# Altium schematic symbol library Minh_Lib.SchLib: 619 symbols (part 4 of 4) (continued)
## TAJC106K025RNJ
designator C?  Supplier Part Number 1: 1360264
钽电容 10uF ±10% 25V 1.8Ω C型6032; Manufacturer: Kyocera AVX; Manufacturer Part Number: TAJC106K025RNJ; Dielectric Material: Tantalum; ESR (Equivalent Series Resistance): 1.8R; Leakage Current: 2.5uA; Dissipation Factor: 6%; Polarity: Polar; Supplier 1: RSComponents; RoHS: Yes; Category: Tantalum Capacitors; Stock 1: 520; Pricing 1: 500=0.40900, 1000=0.39300, 2500=0.37300 (USD); Mount: Surface Mount,PCB; Case/Package: Molded; Number of Pins: 2; Case Code (Metric): 6032; Case Code (Imperial): 2312; Min Operating Temperature: -55°C; Max Operating Temperature: 125°C; Capacitance: 10uF; Tolerance: 10%; Package Quantity: 1; Voltage Rating: 25V; Packaging: Tape and Reel; Voltage Rating (DC): 25V; Termination: SMD/SMT; Voltage: 25V; Features: General Purpose; Series: TAJ; Construction: Flat; Length: 6mm; Width: 3.2mm; Height: 2.6mm; Depth: 3.2mm; Height - Seated (Max): 0.11inch; Radiation Hardening: No; REACH SVHC: No SVHC; Lead Free: Lead Free; RoHS Compliant: Yes; ComponentLink1URL: https://datasheet.ciiva.com/11793/0900766b80ccdc61-11793443.pdf?src-supplier=RSComponents; ComponentLink1Description: https://datasheet.ciiva.com/11793/0900766b80ccdc61-11793443.pdf?src-supplier=RSComponents; ComponentLink2URL: https://datasheet.ciiva.com/26341/559475-da-01-en-tacc-c-6-0-mm-x-3-2-mm-x-2-6-mm-10-uf-26341814.pdf?src-supplier=Conrad; ComponentLink2Description: https://datasheet.ciiva.com/26341/559475-da-01-en-tacc-c-6-0-mm-x-3-2-mm-x-2-6-mm-10-uf-26341814.pdf?src-supplier=Conrad; ComponentLink3URL: https://datasheet.ciiva.com/26787/tajc106k025rnj-26787060.pdf?src-supplier=IIIC; ComponentLink3Description: https://datasheet.ciiva.com/26787/tajc106k025rnj-26787060.pdf?src-supplier=IIIC; ComponentLink4URL: https://datasheet.ciiva.com/5937/taj-5937098.pdf?src-supplier=Farnell; ComponentLink4Description: https://datasheet.ciiva.com/5937/taj-5937098.pdf?src-supplier=Farnell; ComponentLink5URL: https://datasheet.ciiva.com/16486/taj-16486005.pdf?src-supplier=Avnet+Asia; ComponentLink5Description: https://datasheet.ciiva.com/16486/taj-16486005.pdf?src-supplier=Avnet+Asia; ComponentLink6URL: https://datasheet.ciiva.com/16492/taj-16492831.pdf?src-supplier=Future+Electronics; ComponentLink6Description: https://datasheet.ciiva.com/16492/taj-16492831.pdf?src-supplier=Future+Electronics; ComponentLink7URL: https://datasheet.ciiva.com/3004/taj-3004473.pdf?src-supplier=Avnet; ComponentLink7Description: https://datasheet.ciiva.com/3004/taj-3004473.pdf?src-supplier=Avnet; ComponentLink8URL: https://datasheet.ciiva.com/14590/70001050-14590630.pdf?src-supplier=Allied+Electronics; ComponentLink8Description: https://datasheet.ciiva.com/14590/70001050-14590630.pdf?src-supplier=Allied+Electronics; ComponentLink9URL: https://datasheet.ciiva.com/263/taj-263970.pdf?src-supplier=Digi-Key; ComponentLink9Description: https://datasheet.ciiva.com/263/taj-263970.pdf?src-supplier=Digi-Key; ComponentLink10URL: https://datasheet.ciiva.com/263/taj-263968.pdf?src-supplier=Digi-Key; ComponentLink10Description: https://datasheet.ciiva.com/263/taj-263968.pdf?src-supplier=Digi-Key; ComponentLink11URL: https://datasheet.ciiva.com/7730/1826076-7730747.pdf?src-supplier=Element14; ComponentLink11Description: https://datasheet.ciiva.com/7730/1826076-7730747.pdf?src-supplier=Element14; ComponentLink12URL: https://datasheet.ciiva.com/7730/1680476-7730744.pdf?src-supplier=Element14; ComponentLink12Description: https://datasheet.ciiva.com/7730/1680476-7730744.pdf?src-supplier=Element14; ComponentLink13URL: https://datasheet.ciiva.com/7730/1826076-7730746.pdf?src-supplier=Element14; ComponentLink13Description: https://datasheet.ciiva.com/7730/1826076-7730746.pdf?src-supplier=Element14; ComponentLink14URL: https://datasheet.ciiva.com/7730/1826076-7730745.pdf?src-supplier=Element14; ComponentLink14Description: https://datasheet.ciiva.com/7730/1826076-7730745.pdf?src-supplier=Element14; ComponentLink15URL: https://datasheet.ciiva.com/7730/taj-7730982.pdf?src-supplier=Element14; ComponentLink15Description: https://datasheet.ciiva.com/7730/taj-7730982.pdf?src-supplier=Element14; ComponentLink16URL: https://datasheet.ciiva.com/263/taj-263969.pdf?src-supplier=Digi-Key; ComponentLink16Description: https://datasheet.ciiva.com/263/taj-263969.pdf?src-supplier=Digi-Key; ComponentLink17URL: https://datasheet.ciiva.com/3004/taj-3004474.pdf?src-supplier=Avnet; ComponentLink17Description: https://datasheet.ciiva.com/3004/taj-3004474.pdf?src-supplier=Avnet
footprint Capacitor/Tantalum  - SMD6032/C - AVX (C-6032 / AVX)
pins: 1, 2
text: +

## TAJC106K035RNJ
designator C?  Supplier Part Number 1: 23H0347
钽电容 10uF ±10% 35V 1.6Ω C型6032; Manufacturer: Kyocera AVX; Manufacturer Part Number: TAJC106K035RNJ; Dielectric Material: Tantalum; Tolerance: 20%; ESR (Equivalent Series Resistance): 1.6R; Leakage Current: 3.5uA; Polarity: Polar; Voltage: 25V; Dissipation Factor: 6%; Supplier 1: Newark; RoHS: Yes; Category: Tantalum Capacitors; Mount: Surface Mount,PCB; Case/Package: Molded; Number of Pins: 2; Case Code (Imperial): 2412; Case Code (Metric): 6032; Min Operating Temperature: -55°C; Max Operating Temperature: 125°C; Capacitance: 10uF; Voltage Rating (DC): 35V; Voltage Rating: 35V; Packaging: Tape and Reel; Package Quantity: 1; Termination: SMD/SMT; Features: General Purpose; Series: TAJ; Construction: Flat; Length: 6mm; Width: 3.2mm; Height: 2.6mm; Depth: 3.2mm; Height - Seated (Max): 0.11inch; Radiation Hardening: No; Lead Free: Lead Free; RoHS Compliant: Yes; REACH SVHC: No SVHC; ComponentLink1URL: https://datasheet.ciiva.com/11793/0900766b80ccdc61-11793205.pdf?src-supplier=RSComponents; ComponentLink1Description: https://datasheet.ciiva.com/11793/0900766b80ccdc61-11793205.pdf?src-supplier=RSComponents; ComponentLink2URL: https://datasheet.ciiva.com/26341/559442-da-01-en-tacc-c-6-0-mm-x-3-2-mm-x-2-6-mm-10-uf-26341782.pdf?src-supplier=Conrad; ComponentLink2Description: https://datasheet.ciiva.com/26341/559442-da-01-en-tacc-c-6-0-mm-x-3-2-mm-x-2-6-mm-10-uf-26341782.pdf?src-supplier=Conrad; ComponentLink3URL: https://datasheet.ciiva.com/5937/taj-5937099.pdf?src-supplier=Farnell; ComponentLink3Description: https://datasheet.ciiva.com/5937/taj-5937099.pdf?src-supplier=Farnell; ComponentLink4URL: https://datasheet.ciiva.com/15163/getdatasheetpartid-110753-15163367.pdf?src-supplier=Verical; ComponentLink4Description: https://datasheet.ciiva.com/15163/getdatasheetpartid-110753-15163367.pdf?src-supplier=Verical; ComponentLink5URL: https://datasheet.ciiva.com/3004/taj-3004476.pdf?src-supplier=Avnet; ComponentLink5Description: https://datasheet.ciiva.com/3004/taj-3004476.pdf?src-supplier=Avnet; ComponentLink6URL: https://datasheet.ciiva.com/14590/70001050-14590313.pdf?src-supplier=Allied+Electronics; ComponentLink6Description: https://datasheet.ciiva.com/14590/70001050-14590313.pdf?src-supplier=Allied+Electronics; ComponentLink7URL: https://datasheet.ciiva.com/12911/taj-27497-12911561.pdf?src-supplier=Mouser; ComponentLink7Description: https://datasheet.ciiva.com/12911/taj-27497-12911561.pdf?src-supplier=Mouser; ComponentLink8URL: https://datasheet.ciiva.com/264/taj-264351.pdf?src-supplier=Digi-Key; ComponentLink8Description: https://datasheet.ciiva.com/264/taj-264351.pdf?src-supplier=Digi-Key; ComponentLink9URL: https://datasheet.ciiva.com/264/taj-264349.pdf?src-supplier=Digi-Key; ComponentLink9Description: https://datasheet.ciiva.com/264/taj-264349.pdf?src-supplier=Digi-Key; ComponentLink10URL: https://datasheet.ciiva.com/264/taj-264350.pdf?src-supplier=Digi-Key; ComponentLink10Description: https://datasheet.ciiva.com/264/taj-264350.pdf?src-supplier=Digi-Key; ComponentLink11URL: https://datasheet.ciiva.com/7730/13070-7730749.pdf?src-supplier=Element14; ComponentLink11Description: https://datasheet.ciiva.com/7730/13070-7730749.pdf?src-supplier=Element14; ComponentLink12URL: https://datasheet.ciiva.com/7730/1680476-7730748.pdf?src-supplier=Element14; ComponentLink12Description: https://datasheet.ciiva.com/7730/1680476-7730748.pdf?src-supplier=Element14; ComponentLink13URL: https://datasheet.ciiva.com/7730/1703059-7730750.pdf?src-supplier=Element14; ComponentLink13Description: https://datasheet.ciiva.com/7730/1703059-7730750.pdf?src-supplier=Element14; ComponentLink14URL: https://datasheet.ciiva.com/7730/1703059-7730751.pdf?src-supplier=Element14; ComponentLink14Description: https://datasheet.ciiva.com/7730/1703059-7730751.pdf?src-supplier=Element14; ComponentLink15URL: https://datasheet.ciiva.com/7730/taj-7730983.pdf?src-supplier=Element14; ComponentLink15Description: https://datasheet.ciiva.com/7730/taj-7730983.pdf?src-supplier=Element14; ComponentLink16URL: https://datasheet.ciiva.com/16486/taj-16486007.pdf?src-supplier=Avnet+Asia; ComponentLink16Description: https://datasheet.ciiva.com/16486/taj-16486007.pdf?src-supplier=Avnet+Asia; ComponentLink17URL: https://datasheet.ciiva.com/3004/taj-3004475.pdf?src-supplier=Avnet; ComponentLink17Description: https://datasheet.ciiva.com/3004/taj-3004475.pdf?src-supplier=Avnet
footprint Capacitor/Tantalum  - SMD6032/C - AVX (C-6032 / AVX)
pins: 1, 2
text: +

## TAJC107K006RNJ
designator C?  Supplier Part Number 1: 1364517
钽电容 100uF ±10% 6.3V 0.9Ω C型6032; Manufacturer: Kyocera AVX; Manufacturer Part Number: TAJC107K006RNJ; Dielectric Material: Tantalum; ESR (Equivalent Series Resistance): 900mR; Leakage Current: 6.3uA; Polarity: Polar; Dissipation Factor: 6%; Supplier 1: RSComponents; RoHS: Yes; Category: Tantalum Capacitors; Stock 1: 1; Pricing 1: 20=0.52900, 100=0.36400, 400=0.34700, 1000=0.21400 (USD); Mount: Surface Mount; Case/Package: Molded; Case Code (Metric): 6032; Case Code (Imperial): 2312; Min Operating Temperature: -55°C; Max Operating Temperature: 125°C; Capacitance: 100uF; Tolerance: 10%; Packaging: Tape and Reel; Voltage Rating: 6.3V; Package Quantity: 1; Termination: SMD/SMT; Features: General Purpose; Series: TAJ; Construction: Flat; Length: 6mm; Width: 3.2mm; Height: 2.6mm; Depth: 3.2mm; Height - Seated (Max): 0.11inch; Radiation Hardening: No; REACH SVHC: No SVHC; Lead Free: Lead Free; RoHS Compliant: Yes; ComponentLink1URL: https://datasheet.ciiva.com/26341/559444-da-01-en-tacc-c-6-0-mm-x-3-2-mm-x-2-6-mm-100-uf-26341781.pdf?src-supplier=Conrad; ComponentLink1Description: https://datasheet.ciiva.com/26341/559444-da-01-en-tacc-c-6-0-mm-x-3-2-mm-x-2-6-mm-100-uf-26341781.pdf?src-supplier=Conrad; ComponentLink2URL: https://datasheet.ciiva.com/18710/taj-eng-18710877.pdf?src-supplier=Distrelec; ComponentLink2Description: https://datasheet.ciiva.com/18710/taj-eng-18710877.pdf?src-supplier=Distrelec; ComponentLink3URL: https://datasheet.ciiva.com/7720/1680476-7720614.pdf?src-supplier=Element14; ComponentLink3Description: https://datasheet.ciiva.com/7720/1680476-7720614.pdf?src-supplier=Element14; ComponentLink4URL: https://datasheet.ciiva.com/7720/1680476-7720613.pdf?src-supplier=Element14; ComponentLink4Description: https://datasheet.ciiva.com/7720/1680476-7720613.pdf?src-supplier=Element14; ComponentLink5URL: https://datasheet.ciiva.com/264/taj-264329.pdf?src-supplier=Digi-Key; ComponentLink5Description: https://datasheet.ciiva.com/264/taj-264329.pdf?src-supplier=Digi-Key; ComponentLink6URL: https://datasheet.ciiva.com/264/taj-264328.pdf?src-supplier=Digi-Key; ComponentLink6Description: https://datasheet.ciiva.com/264/taj-264328.pdf?src-supplier=Digi-Key; ComponentLink7URL: https://datasheet.ciiva.com/264/taj-264330.pdf?src-supplier=Digi-Key; ComponentLink7Description: https://datasheet.ciiva.com/264/taj-264330.pdf?src-supplier=Digi-Key; ComponentLink8URL: https://datasheet.ciiva.com/12910/taj-27497-12910474.pdf?src-supplier=Mouser; ComponentLink8Description: https://datasheet.ciiva.com/12910/taj-27497-12910474.pdf?src-supplier=Mouser; ComponentLink9URL: https://datasheet.ciiva.com/3004/taj-3004480.pdf?src-supplier=Avnet; ComponentLink9Description: https://datasheet.ciiva.com/3004/taj-3004480.pdf?src-supplier=Avnet; ComponentLink10URL: https://datasheet.ciiva.com/3004/taj-3004481.pdf?src-supplier=Avnet; ComponentLink10Description: https://datasheet.ciiva.com/3004/taj-3004481.pdf?src-supplier=Avnet
footprint Capacitor/Tantalum  - SMD6032/C - AVX (C-6032 / AVX)
pins: 1, 2
text: +

## TAJC107K010RNJ
designator C?  Supplier Part Number 1: 1360270
钽电容 100uF ±10% 10V 1.2Ω C型6032; Manufacturer: Kyocera AVX; Manufacturer Part Number: TAJC107K010RNJ; Dielectric Material: Tantalum; ESR (Equivalent Series Resistance): 1.2R; Leakage Current: 10uA; Polarity: Polar; Dissipation Factor: 8%; Supplier 1: RSComponents; RoHS: Yes; Category: Tantalum Capacitors; Stock 1: 300; Pricing 1: 500=0.21900, 2500=0.19900, 5000=0.19400 (USD); Mount: Surface Mount,PCB; Case/Package: Molded; Number of Pins: 2; Case Code (Imperial): 2412; Case Code (Metric): 6032; Min Operating Temperature: -55°C; Max Operating Temperature: 125°C; Capacitance: 100uF; Tolerance: 10%; Voltage Rating (DC): 10V; Packaging: Tape and Reel; Package Quantity: 1; Voltage Rating: 10V; Termination: SMD/SMT; Voltage: 10V; Features: General Purpose; Series: TAJ; Construction: Flat; Length: 6mm; Width: 3.2mm; Height: 2.6mm; Depth: 3.2mm; Height - Seated (Max): 0.11inch; Radiation Hardening: No; REACH SVHC: No SVHC; Lead Free: Lead Free; RoHS Compliant: Yes; ComponentLink1URL: https://datasheet.ciiva.com/11793/0900766b80ccdc61-11793710.pdf?src-supplier=RSComponents; ComponentLink1Description: https://datasheet.ciiva.com/11793/0900766b80ccdc61-11793710.pdf?src-supplier=RSComponents; ComponentLink2URL: https://datasheet.ciiva.com/6186/13070-6186737.pdf?src-supplier=Farnell; ComponentLink2Description: https://datasheet.ciiva.com/6186/13070-6186737.pdf?src-supplier=Farnell; ComponentLink3URL: https://datasheet.ciiva.com/26341/559445-da-01-en-tacc-c-6-0-mm-x-3-2-mm-x-2-6-mm-100-uf-26341786.pdf?src-supplier=Conrad; ComponentLink3Description: https://datasheet.ciiva.com/26341/559445-da-01-en-tacc-c-6-0-mm-x-3-2-mm-x-2-6-mm-100-uf-26341786.pdf?src-supplier=Conrad; ComponentLink4URL: https://datasheet.ciiva.com/18710/taj-eng-18710871.pdf?src-supplier=Distrelec; ComponentLink4Description: https://datasheet.ciiva.com/18710/taj-eng-18710871.pdf?src-supplier=Distrelec; ComponentLink5URL: https://datasheet.ciiva.com/15163/getdatasheetpartid-87208-15163226.pdf?src-supplier=Verical; ComponentLink5Description: https://datasheet.ciiva.com/15163/getdatasheetpartid-87208-15163226.pdf?src-supplier=Verical; ComponentLink6URL: https://datasheet.ciiva.com/16350/taj-16350362.pdf?src-supplier=Future+Electronics; ComponentLink6Description: https://datasheet.ciiva.com/16350/taj-16350362.pdf?src-supplier=Future+Electronics; ComponentLink7URL: https://datasheet.ciiva.com/11226/taj-11226030.pdf?src-supplier=Avnet; ComponentLink7Description: https://datasheet.ciiva.com/11226/taj-11226030.pdf?src-supplier=Avnet; ComponentLink8URL: https://datasheet.ciiva.com/14608/70001050-14608635.pdf?src-supplier=Allied+Electronics; ComponentLink8Description: https://datasheet.ciiva.com/14608/70001050-14608635.pdf?src-supplier=Allied+Electronics; ComponentLink9URL: https://datasheet.ciiva.com/14590/70001050-14590206.pdf?src-supplier=Allied+Electronics; ComponentLink9Description: https://datasheet.ciiva.com/14590/70001050-14590206.pdf?src-supplier=Allied+Electronics; ComponentLink10URL: https://datasheet.ciiva.com/264/taj-264318.pdf?src-supplier=Digi-Key; ComponentLink10Description: https://datasheet.ciiva.com/264/taj-264318.pdf?src-supplier=Digi-Key; ComponentLink11URL: https://datasheet.ciiva.com/264/taj-264316.pdf?src-supplier=Digi-Key; ComponentLink11Description: https://datasheet.ciiva.com/264/taj-264316.pdf?src-supplier=Digi-Key; ComponentLink12URL: https://datasheet.ciiva.com/264/taj-264317.pdf?src-supplier=Digi-Key; ComponentLink12Description: https://datasheet.ciiva.com/264/taj-264317.pdf?src-supplier=Digi-Key; ComponentLink13URL: https://datasheet.ciiva.com/7720/13070-7720615.pdf?src-supplier=Element14; ComponentLink13Description: https://datasheet.ciiva.com/7720/13070-7720615.pdf?src-supplier=Element14; ComponentLink14URL: https://datasheet.ciiva.com/7720/1680476-7720617.pdf?src-supplier=Element14; ComponentLink14Description: https://datasheet.ciiva.com/7720/1680476-7720617.pdf?src-supplier=Element14; ComponentLink15URL: https://datasheet.ciiva.com/7720/taj-7720618.pdf?src-supplier=Element14; ComponentLink15Description: https://datasheet.ciiva.com/7720/taj-7720618.pdf?src-supplier=Element14; ComponentLink16URL: https://datasheet.ciiva.com/7720/taj-7720616.pdf?src-supplier=Element14; ComponentLink16Description: https://datasheet.ciiva.com/7720/taj-7720616.pdf?src-supplier=Element14; ComponentLink17URL: https://datasheet.ciiva.com/7720/taj-7720830.pdf?src-supplier=Element14; ComponentLink17Description: https://datasheet.ciiva.com/7720/taj-7720830.pdf?src-supplier=Element14; ComponentLink18URL: https://datasheet.ciiva.com/16486/taj-16486014.pdf?src-supplier=Avnet+Asia; ComponentLink18Description: https://datasheet.ciiva.com/16486/taj-16486014.pdf?src-supplier=Avnet+Asia; ComponentLink19URL: https://datasheet.ciiva.com/3004/taj-3004482.pdf?src-supplier=Avnet; ComponentLink19Description: https://datasheet.ciiva.com/3004/taj-3004482.pdf?src-supplier=Avnet
footprint Capacitor/Tantalum  - SMD6032/C - AVX (C-6032 / AVX)
pins: 1, 2
text: +

## TAJC107K016RNJ
designator C?  Supplier Part Number 1: 478-5258-1-ND
钽电容 100uF ±10% 16V 1Ω C型6032; Manufacturer: Kyocera AVX; Manufacturer Part Number: TAJC107K016RNJ; ESR (Equivalent Series Resistance): 1R; Leakage Current: 16uA; Polarity: Polar; Dissipation Factor: 8%; Supplier 1: Digi-Key; RoHS: Yes; Category: Tantalum Capacitors; Stock 1: 1470; Pricing 1: 1=1.31000, 10=1.03600, 50=0.89800, 100=0.77720 (USD); Mount: Surface Mount; Case/Package: Molded; Number of Pins: 2; Case Code (Imperial): 2412; Case Code (Metric): 6032; Min Operating Temperature: -55°C; Max Operating Temperature: 125°C; Capacitance: 100uF; Tolerance: 10%; Voltage Rating: 16V; Package Quantity: 1; Packaging: Tape and Reel; Termination: SMD/SMT; Voltage Rating (DC): 16V; Features: General Purpose; Series: TAJ; Construction: Flat; Length: 6mm; Width: 3.2mm; Height: 2.8mm; Depth: 3.2mm; Height - Seated (Max): 0.11inch; Radiation Hardening: No; REACH SVHC: No SVHC; Lead Free: Lead Free; RoHS Compliant: Yes; ComponentLink1URL: https://datasheet.ciiva.com/22667/1719052-22667577.pdf?src-supplier=Element14; ComponentLink1Description: https://datasheet.ciiva.com/22667/1719052-22667577.pdf?src-supplier=Element14; ComponentLink2URL: https://datasheet.ciiva.com/28609/1719052-28609194.pdf?src-supplier=Element14; ComponentLink2Description: https://datasheet.ciiva.com/28609/1719052-28609194.pdf?src-supplier=Element14; ComponentLink3URL: https://datasheet.ciiva.com/264/taj-264646.pdf?src-supplier=Digi-Key; ComponentLink3Description: https://datasheet.ciiva.com/264/taj-264646.pdf?src-supplier=Digi-Key; ComponentLink4URL: https://datasheet.ciiva.com/264/taj-264645.pdf?src-supplier=Digi-Key; ComponentLink4Description: https://datasheet.ciiva.com/264/taj-264645.pdf?src-supplier=Digi-Key; ComponentLink5URL: https://datasheet.ciiva.com/264/taj-264647.pdf?src-supplier=Digi-Key; ComponentLink5Description: https://datasheet.ciiva.com/264/taj-264647.pdf?src-supplier=Digi-Key; ComponentLink6URL: https://datasheet.ciiva.com/11216/taj-11216685.pdf?src-supplier=Avnet; ComponentLink6Description: https://datasheet.ciiva.com/11216/taj-11216685.pdf?src-supplier=Avnet
footprint Capacitor/Tantalum  - SMD6032/C - AVX (C-6032 / AVX)
pins: 1, 2
text: +

## TAJC474K050RNJ
designator C?  Supplier Part Number 1: TAJC474K050RNJ
钽电容 470nF ±10% 50V 8Ω C型6032; Manufacturer: Kyocera AVX; Dielectric Material: Tantalum; ESR (Equivalent Series Resistance): 8R; Leakage Current: 500nA; Polarity: Polar; Dissipation Factor: 4%; Q Factor: 4; Supplier 1: Arrow Electronics; Manufacturer Part Number: TAJC474K050RNJ; RoHS: Yes; Category: Tantalum Capacitors; Stock 1: 280; Pricing 1: 1=1.01870, 10=0.78040, 25=0.77240, 50=0.76420, 100=0.54780, 500=0.33230 (USD); Mount: Surface Mount; Case/Package: Molded; Number of Pins: 2; Case Code (Metric): 6032; Case Code (Imperial): 2412; Min Operating Temperature: -55°C; Max Operating Temperature: 125°C; Capacitance: 470nF; Tolerance: 10%; Package Quantity: 500; Voltage Rating: 50V; Packaging: Tape and Reel; Termination: SMD/SMT; Voltage Rating (DC): 50V; Features: General Purpose; Series: TAJ; Construction: Flat; Length: 6mm; Width: 0.126inch; Height: 2.8mm; Depth: 3.2mm; Height - Seated (Max): 0.11inch; Radiation Hardening: No; Lead Free: Lead Free; RoHS Compliant: Yes; ComponentLink1URL: https://datasheet.ciiva.com/12883/taj-27497-12883740.pdf?src-supplier=Mouser; ComponentLink1Description: https://datasheet.ciiva.com/12883/taj-27497-12883740.pdf?src-supplier=Mouser; ComponentLink2URL: https://datasheet.ciiva.com/11219/taj-11219271.pdf?src-supplier=Avnet; ComponentLink2Description: https://datasheet.ciiva.com/11219/taj-11219271.pdf?src-supplier=Avnet; ComponentLink3URL: https://datasheet.ciiva.com/17337/taj-17337293.pdf?src-supplier=Avnet+Europe; ComponentLink3Description: https://datasheet.ciiva.com/17337/taj-17337293.pdf?src-supplier=Avnet+Europe; ComponentLink4URL: https://datasheet.ciiva.com/284/taj-284115.pdf?src-supplier=Digi-Key; ComponentLink4Description: https://datasheet.ciiva.com/284/taj-284115.pdf?src-supplier=Digi-Key
footprint Capacitor/Tantalum  - SMD6032/C - AVX (C-6032 / AVX)
pins: 1, 2
text: +

## TAJC684K050RNJ
designator C?  Supplier Part Number 1: 581-TAJC684K050RNJ
钽电容 680nF ±10% 50V 7Ω C型6032; Manufacturer: Kyocera AVX; Manufacturer Part Number: TAJC684K050RNJ; Dielectric Material: Tantalum; ESR (Equivalent Series Resistance): 7R; Leakage Current: 500nA; Polarity: Polar; Dissipation Factor: 4%; Q Factor: 4; Supplier 1: Mouser; RoHS: Yes; Category: Tantalum Capacitors; Stock 1: 252; Pricing 1: 1=1.88000, 10=1.49000, 50=1.49000, 100=1.12000, 1000=0.84200, 10000=0.84200 (USD); Mount: Surface Mount; Case/Package: Molded; Number of Pins: 2; Case Code (Imperial): 2412; Case Code (Metric): 6032; Weight: 0.005291oz; Min Operating Temperature: -55°C; Max Operating Temperature: 125°C; Capacitance: 680nF; Voltage Rating: 50V; Tolerance: 10%; Packaging: Tape and Reel; Package Quantity: 500; Resistance: 7R; Termination: SMD/SMT; Voltage Rating (DC): 50V; Features: General Purpose; Series: TAJ; Construction: Flat; Length: 6mm; Width: 3.2mm; Height: 2.8mm; Height - Seated (Max): 0.11inch; Depth: 3.2mm; Radiation Hardening: No; Lead Free: Lead Free; RoHS Compliant: Yes; ComponentLink1URL: https://datasheet.ciiva.com/264/taj-264652.pdf?src-supplier=Digi-Key; ComponentLink1Description: https://datasheet.ciiva.com/264/taj-264652.pdf?src-supplier=Digi-Key; ComponentLink2URL: https://datasheet.ciiva.com/264/taj-264651.pdf?src-supplier=Digi-Key; ComponentLink2Description: https://datasheet.ciiva.com/264/taj-264651.pdf?src-supplier=Digi-Key; ComponentLink3URL: https://datasheet.ciiva.com/264/taj-264653.pdf?src-supplier=Digi-Key; ComponentLink3Description: https://datasheet.ciiva.com/264/taj-264653.pdf?src-supplier=Digi-Key
footprint Capacitor/Tantalum  - SMD6032/C - AVX (C-6032 / AVX)
pins: 1, 2
text: +

## TAJD106K025RNJ
designator C?  Supplier Part Number 1: 1360311
钽电容 10uF ±10% 25V 1.2Ω D型7343; Manufacturer: Kyocera AVX; Manufacturer Part Number: TAJD106K025RNJ; Dielectric Material: Tantalum; ESR (Equivalent Series Resistance): 1.2R; Leakage Current: 2.5uA; Polarity: Polar; Dissipation Factor: 6%; Q Factor: 6; Supplier 1: RSComponents; RoHS: Yes; Category: Tantalum Capacitors; Stock 1: 1; Pricing 1: 500=0.54200, 2500=0.44700, 5000=0.41000, 12500=0.37800, 25000=0.34700 (USD); Mount: Surface Mount,PCB; Case/Package: 2917; Case Code (Metric): 7343; Case Code (Imperial): 2917; Min Operating Temperature: -55°C; Max Operating Temperature: 125°C; Capacitance: 10uF; Tolerance: 10%; Voltage Rating (DC): 25V; Packaging: Tape and Reel; Package Quantity: 1; Voltage Rating: 25V; Termination: SMD/SMT; Voltage: 25V; Features: General Purpose; Series: TAJ; Length: 7.3mm; Width: 4.3mm; Height: 2.9mm; Depth: 4.3mm; Height - Seated (Max): 0.122inch; Radiation Hardening: No; Lead Free: Lead Free; RoHS Compliant: Yes; REACH SVHC: No SVHC; ComponentLink1URL: https://datasheet.ciiva.com/11794/0900766b80ccdc61-11794404.pdf?src-supplier=RSComponents; ComponentLink1Description: https://datasheet.ciiva.com/11794/0900766b80ccdc61-11794404.pdf?src-supplier=RSComponents; ComponentLink2URL: https://datasheet.ciiva.com/26341/559461-da-01-en-tacc-d-7-3-mm-x-4-3-mm-x-2-9-mm-10-uf-26341800.pdf?src-supplier=Conrad; ComponentLink2Description: https://datasheet.ciiva.com/26341/559461-da-01-en-tacc-d-7-3-mm-x-4-3-mm-x-2-9-mm-10-uf-26341800.pdf?src-supplier=Conrad; ComponentLink3URL: https://datasheet.ciiva.com/264/taj-264403.pdf?src-supplier=Digi-Key; ComponentLink3Description: https://datasheet.ciiva.com/264/taj-264403.pdf?src-supplier=Digi-Key; ComponentLink4URL: https://datasheet.ciiva.com/264/taj-264402.pdf?src-supplier=Digi-Key; ComponentLink4Description: https://datasheet.ciiva.com/264/taj-264402.pdf?src-supplier=Digi-Key; ComponentLink5URL: https://datasheet.ciiva.com/264/taj-264404.pdf?src-supplier=Digi-Key; ComponentLink5Description: https://datasheet.ciiva.com/264/taj-264404.pdf?src-supplier=Digi-Key; ComponentLink6URL: https://datasheet.ciiva.com/12883/taj-27497-12883020.pdf?src-supplier=Mouser; ComponentLink6Description: https://datasheet.ciiva.com/12883/taj-27497-12883020.pdf?src-supplier=Mouser; ComponentLink7URL: https://datasheet.ciiva.com/14604/70001050-14604747.pdf?src-supplier=Allied+Electronics; ComponentLink7Description: https://datasheet.ciiva.com/14604/70001050-14604747.pdf?src-supplier=Allied+Electronics; ComponentLink8URL: https://datasheet.ciiva.com/14603/70001050-14603470.pdf?src-supplier=Allied+Electronics; ComponentLink8Description: https://datasheet.ciiva.com/14603/70001050-14603470.pdf?src-supplier=Allied+Electronics; ComponentLink9URL: https://datasheet.ciiva.com/3004/taj-3004505.pdf?src-supplier=Avnet; ComponentLink9Description: https://datasheet.ciiva.com/3004/taj-3004505.pdf?src-supplier=Avnet; ComponentLink10URL: https://datasheet.ciiva.com/16201/taj-16201879.pdf?src-supplier=Future+Electronics; ComponentLink10Description: https://datasheet.ciiva.com/16201/taj-16201879.pdf?src-supplier=Future+Electronics; ComponentLink11URL: https://datasheet.ciiva.com/16632/taj-16632697.pdf?src-supplier=Avnet+Europe; ComponentLink11Description: https://datasheet.ciiva.com/16632/taj-16632697.pdf?src-supplier=Avnet+Europe; ComponentLink12URL: https://datasheet.ciiva.com/16485/taj-16485806.pdf?src-supplier=Avnet+Asia; ComponentLink12Description: https://datasheet.ciiva.com/16485/taj-16485806.pdf?src-supplier=Avnet+Asia; ComponentLink13URL: https://datasheet.ciiva.com/3004/taj-3004504.pdf?src-supplier=Avnet; ComponentLink13Description: https://datasheet.ciiva.com/3004/taj-3004504.pdf?src-supplier=Avnet
footprint Capacitor/Tantalum - SMD7343/D-AVX (D-7343/AVX)
pins: 1, 2
text: +

## TAJD106K035RNJ
designator C?  Supplier Part Number 1: 1360312
钽电容 10uF ±10% 35V 1Ω D型7343; Manufacturer: Kyocera AVX; Manufacturer Part Number: TAJD106K035RNJ; Dielectric Material: Tantalum; ESR (Equivalent Series Resistance): 1R; Leakage Current: 3.5uA; Polarity: Polar; Dissipation Factor: 6%; Q Factor: 6; Supplier 1: RSComponents; RoHS: Yes; Category: Tantalum Capacitors; Stock 1: 70; Pricing 1: 500=0.64300, 1000=0.61600 (USD); Mount: Surface Mount,PCB; Case/Package: 2917; Number of Pins: 2; Case Code (Metric): 7343; Case Code (Imperial): 2917; Min Operating Temperature: -55°C; Max Operating Temperature: 125°C; Capacitance: 10uF; Tolerance: 10%; Voltage Rating (DC): 35V; Packaging: Tape and Reel; Voltage Rating: 35V; Package Quantity: 1; Termination: SMD/SMT; Voltage: 35V; Features: General Purpose; Series: TAJ; Construction: Flat; Length: 7.3mm; Width: 4.3mm; Height: 2.9mm; Depth: 4.3mm; Height - Seated (Max): 0.122inch; Radiation Hardening: No; Lead Free: Lead Free; RoHS Compliant: Yes; REACH SVHC: No SVHC; ComponentLink1URL: https://datasheet.ciiva.com/11793/0900766b80ccdc61-11793197.pdf?src-supplier=RSComponents; ComponentLink1Description: https://datasheet.ciiva.com/11793/0900766b80ccdc61-11793197.pdf?src-supplier=RSComponents; ComponentLink2URL: https://datasheet.ciiva.com/26341/559462-da-01-en-tacc-d-7-3-mm-x-4-3-mm-x-2-9-mm-10-uf-26341799.pdf?src-supplier=Conrad; ComponentLink2Description: https://datasheet.ciiva.com/26341/559462-da-01-en-tacc-d-7-3-mm-x-4-3-mm-x-2-9-mm-10-uf-26341799.pdf?src-supplier=Conrad; ComponentLink3URL: https://datasheet.ciiva.com/26787/tajd106k035rnj-26787062.pdf?src-supplier=IIIC; ComponentLink3Description: https://datasheet.ciiva.com/26787/tajd106k035rnj-26787062.pdf?src-supplier=IIIC; ComponentLink4URL: https://datasheet.ciiva.com/18709/taj-eng-18709615.pdf?src-supplier=Distrelec; ComponentLink4Description: https://datasheet.ciiva.com/18709/taj-eng-18709615.pdf?src-supplier=Distrelec; ComponentLink5URL: https://datasheet.ciiva.com/16632/taj-16632698.pdf?src-supplier=Avnet+Europe; ComponentLink5Description: https://datasheet.ciiva.com/16632/taj-16632698.pdf?src-supplier=Avnet+Europe; ComponentLink6URL: https://datasheet.ciiva.com/16357/taj-16357989.pdf?src-supplier=Future+Electronics; ComponentLink6Description: https://datasheet.ciiva.com/16357/taj-16357989.pdf?src-supplier=Future+Electronics; ComponentLink7URL: https://datasheet.ciiva.com/3004/taj-3004507.pdf?src-supplier=Avnet; ComponentLink7Description: https://datasheet.ciiva.com/3004/taj-3004507.pdf?src-supplier=Avnet; ComponentLink8URL: https://datasheet.ciiva.com/14587/70001050-14587319.pdf?src-supplier=Allied+Electronics; ComponentLink8Description: https://datasheet.ciiva.com/14587/70001050-14587319.pdf?src-supplier=Allied+Electronics; ComponentLink9URL: https://datasheet.ciiva.com/14599/70001050-14599982.pdf?src-supplier=Allied+Electronics; ComponentLink9Description: https://datasheet.ciiva.com/14599/70001050-14599982.pdf?src-supplier=Allied+Electronics; ComponentLink10URL: https://datasheet.ciiva.com/12911/taj-27497-12911722.pdf?src-supplier=Mouser; ComponentLink10Description: https://datasheet.ciiva.com/12911/taj-27497-12911722.pdf?src-supplier=Mouser; ComponentLink11URL: https://datasheet.ciiva.com/7730/1826076-7730758.pdf?src-supplier=Element14; ComponentLink11Description: https://datasheet.ciiva.com/7730/1826076-7730758.pdf?src-supplier=Element14; ComponentLink12URL: https://datasheet.ciiva.com/264/taj-264375.pdf?src-supplier=Digi-Key; ComponentLink12Description: https://datasheet.ciiva.com/264/taj-264375.pdf?src-supplier=Digi-Key; ComponentLink13URL: https://datasheet.ciiva.com/264/taj-264373.pdf?src-supplier=Digi-Key; ComponentLink13Description: https://datasheet.ciiva.com/264/taj-264373.pdf?src-supplier=Digi-Key; ComponentLink14URL: https://datasheet.ciiva.com/264/taj-264374.pdf?src-supplier=Digi-Key; ComponentLink14Description: https://datasheet.ciiva.com/264/taj-264374.pdf?src-supplier=Digi-Key; ComponentLink15URL: https://datasheet.ciiva.com/7730/1826076-7730760.pdf?src-supplier=Element14; ComponentLink15Description: https://datasheet.ciiva.com/7730/1826076-7730760.pdf?src-supplier=Element14; ComponentLink16URL: https://datasheet.ciiva.com/5936/13070-5936876.pdf?src-supplier=Farnell; ComponentLink16Description: https://datasheet.ciiva.com/5936/13070-5936876.pdf?src-supplier=Farnell; ComponentLink17URL: https://datasheet.ciiva.com/7730/1826076-7730759.pdf?src-supplier=Element14; ComponentLink17Description: https://datasheet.ciiva.com/7730/1826076-7730759.pdf?src-supplier=Element14; ComponentLink18URL: https://datasheet.ciiva.com/7730/1826076-7730757.pdf?src-supplier=Element14; ComponentLink18Description: https://datasheet.ciiva.com/7730/1826076-7730757.pdf?src-supplier=Element14; ComponentLink19URL: https://datasheet.ciiva.com/3004/taj-3004506.pdf?src-supplier=Avnet; ComponentLink19Description: https://datasheet.ciiva.com/3004/taj-3004506.pdf?src-supplier=Avnet